# Altium schematic symbol library 13-Logicold 逻辑 IC.SchLib: 297 symbols (part 13 of 30)
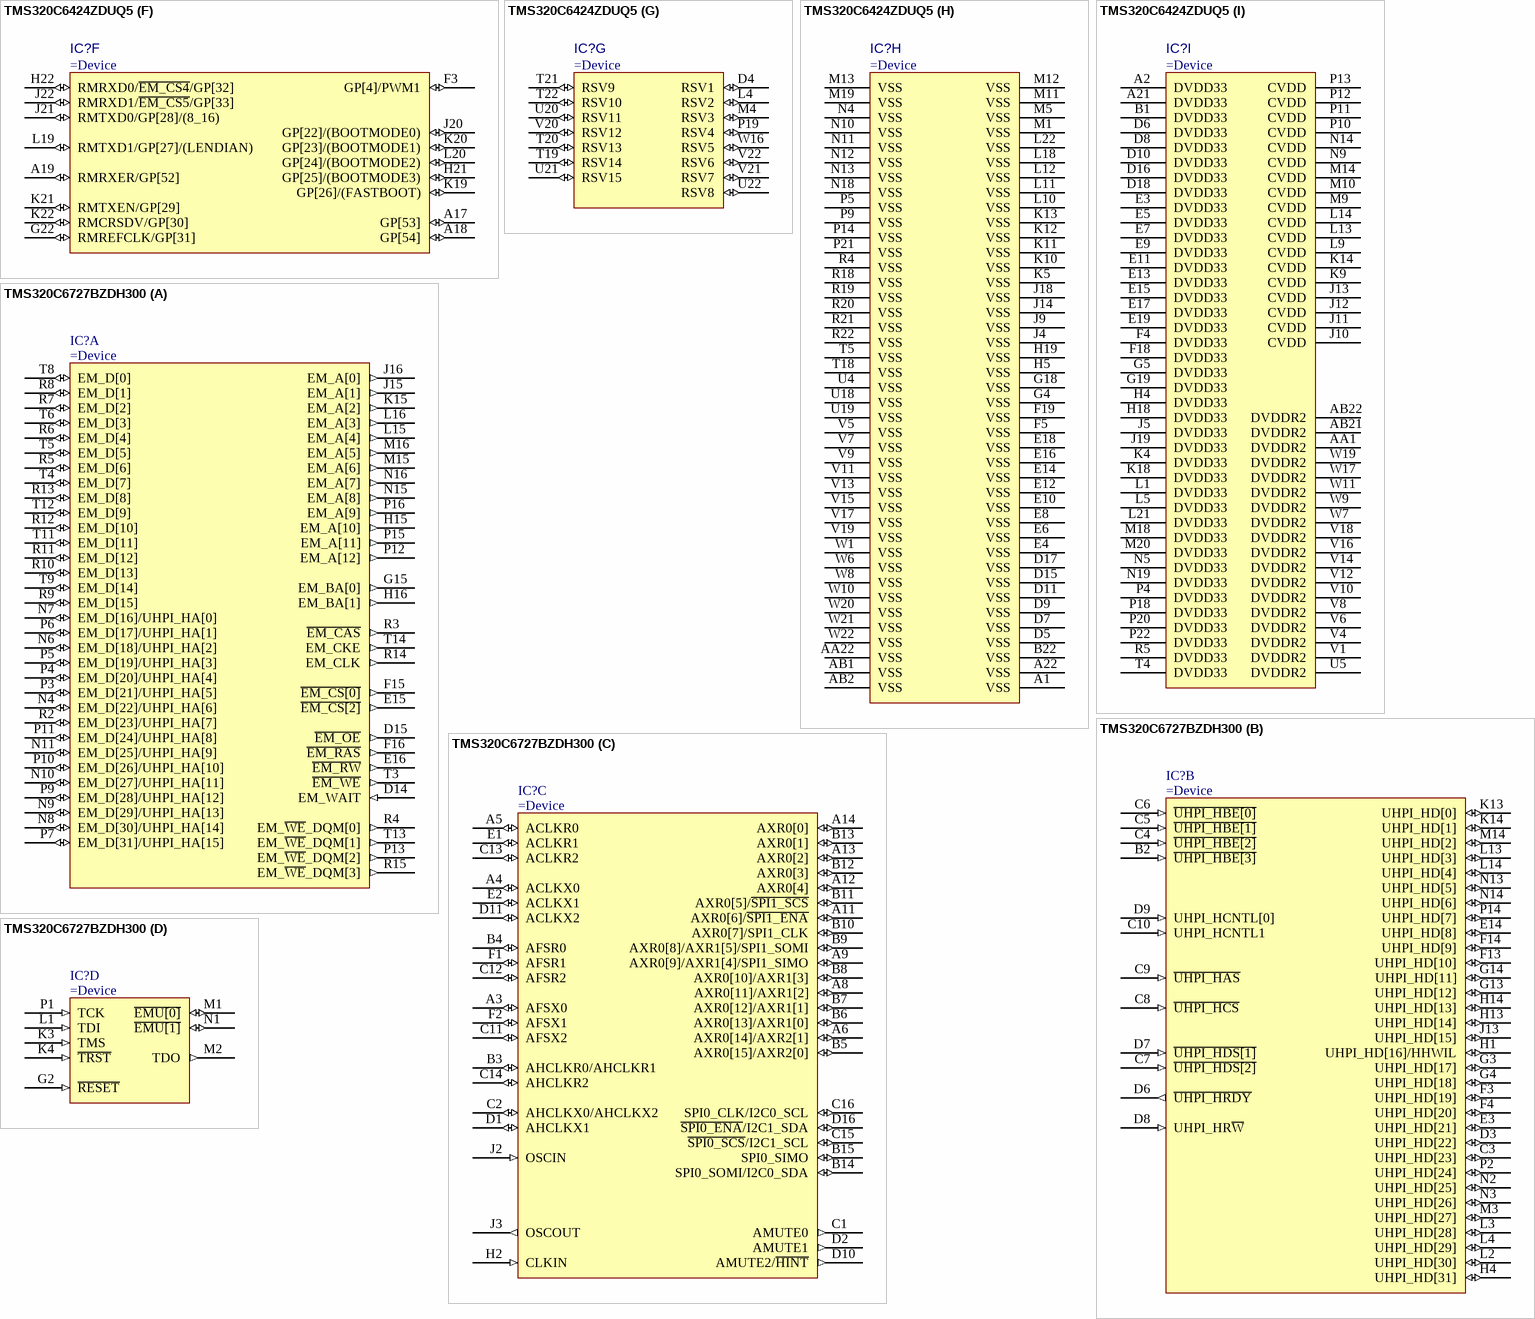
[diagram p174: symbols TMS320C6424ZDUQ5 to TMS320C6727BZDH300]

## TMS320C6424ZDUQ5
designator IC?
Fixed-Point Digital Signal Processor (DSP)
part A pins: M21 MXVSS (io), M22 MXO (out), N2 SCL (io), N20 PLLPWR18 (power), N21 MXVDD (power), N22 MXI/CLKIN (in), P2 SDA (io), R2 ~{POR} (in), R3 ~{RESET} (in), T1 EMU0 (io), T2 EMU1 (io), T3 ~{RESETOUT} (out), U1 TCK (in), U2 TDO (out), U3 TDI (in), V2 ~{TRST} (in), V3 TMS (in), W3 PCIEN (in)
part B pins: G1 ACLKX0/CLKX1/GP[106] (io), G2 AFSX0/DX1/GP[107] (io), G3 AMUTEIN0/FSX1/GP[109] (io), H1 AHCLKX0/CLKR1/GP[108] (io), H2 AXR0[0]/FSR1/GP[105] (io), H3 AMUTE0/DR1/GP[110] (io), J1 ACLKR0/CLKX0/GP[99] (io), J2 AXR0[2]/FSX0/GP[103] (io), J3 AXR0[3]/FSR0/GP[102] (io), K1 AHCLKR0/CLKR0/GP[101] (io), K2 AXR0[1]/DX0/GP[104] (io), K3 AFSR0/DR0/GP[100] (io), L2 CLKS1/TINP0L/GP[98] (io), L3 CLKS0/TOUT0L/GP[97] (io), M2 URXD0/GP[85] (io), M3 URTS0/PWM0/GP[88] (io), N1 UTXD0/GP[86] (io), N3 TOUT1L/UTXD1/GP[55] (io), P1 UCTS0/GP[87] (io), P3 TINP1L/URXD1/GP[56] (io), R1 CLKOUT0/PWM2/GP[84] (io)
part C pins: AA2 DDR_D[3] (io), AA3 DDR_D[4] (io), AA4 DDR_DQS[0] (io), AA5 DDR_D[10] (io), AA6 DDR_D[13] (io), AA7 DDR_DQS[1] (io), AA8 DDR_CKE (io), AA9 DDR_BS[0] (io), AA10 DDR_A[12] (io), AA11 DDR_A[11] (io), AA12 DDR_A[9] (io), AA13 DDR_A[6] (io), AA14 DDR_A[3] (io), AA15 DDR_DQS[2] (io), AA16 DDR_D[16] (io), AA17 DDR_D[19] (io), AA18 DDR_DQS[3] (io), AA19 DDR_D[23] (io), AA20 DDR_D[26] (io), AA21 DDR_D[30] (io), AB3 DDR_D[6] (io), AB4 DDR_D[8] (io), AB5 DDR_D[12] (io), AB6 DDR_D[15] (io), AB7 DDR_CLK0 (io), AB8 ~{DDR_CLK0} (io), AB9 DDR_BS[1] (io), AB10 DDR_BS[2] (io), AB11 DDR_A[10] (io), AB12 DDR_A[7] (io), AB13 DDR_A[4] (io), AB14 DDR_A[1] (io), AB15 DDR_A[0] (io), AB16 DDR_D[18] (io), AB17 DDR_D[21] (io), AB18 DDR_D[22] (io), AB19 DDR_D[25] (io), AB20 DDR_D[28] (io), W2 DDR_D[2] (io), W4 DDR_D[7] (io), W5 DDR_D[9] (io), W12 DDR_ZN (out), W13 DDR_ZP (out), W14 DDR_VDDDLL (power), W15 DDR_VSSDLL (io), W18 DDR_VREF (in), Y1 DDR_D[0] (io), Y2 DDR_D[1] (io), Y3 DDR_D[5] (io), Y4 DDR_DQM[0] (io), Y5 DDR_D[11] (io), Y6 DDR_D[14] (io), Y7 DDR_DQM[1] (io), Y8 ~{DDR_RAS} (io), Y9 ~{DDR_CAS} (io), Y10 ~{DDR_WE} (io), Y11 ~{DDR_CS} (io), Y12 DDR_A[8] (io), Y13 DDR_A[5] (io), Y14 DDR_A[2] (io), Y15 DDR_DQM[2] (io), Y16 DDR_D[17] (io), Y17 DDR_D[20] (io), Y18 DDR_DQM[3] (io), Y19 DDR_D[24] (io), Y20 DDR_D[27] (io), Y21 DDR_D[29] (io), Y22 DDR_D[31] (io)
part D pins: A3 HR/~{W}/MRXCLK/AD8/GP[77] (io), A4 HD15/MTXCLK/AD12/GP[73] (io), A5 HD11/MTXD3/~{PCBE1}/GP[69] (io), A6 HD8/VLYNQ_TXD3/~{PPERR}/GP[66] (io), A7 HD5/VLYNQ_TXD0/~{PIRDY}/GP[63] (io), A8 VLYNQ_CLOCK/PCICLK/GP[57] (io), A9 HD2/VLYNQ_RXD1/AD17/GP[60] (io), B2 HCNTL0/MRXER/AD10/GP[76] (io), B3 ~{HDS1}/MRXD1/AD7/GP[79] (io), B4 HD13/MTXD1/AD14/GP[71] (io), B5 HD14/MTXD0/AD15/GP[72] (io), B6 HD10/MCRS/~{PSERR}/GP[68] (io), B7 HD7/VLYNQ_TXD2/~{PDEVSEL}/GP[65] (io), B8 HD3/VLYNQ_RXD2/~{PCBE2}/GP[61] (io), B9 HD0/VLYNQ_SCRUN/AD18/GP[58] (io), C1 ~{HAS}/MDIO/AD3/GP[83] (io), C2 ~{HDS2}/MRXD0/AD9/GP[78] (io), C3 ~{HRDY}/MRXD2/~{PCBE0}/GP[80] (io), C4 HCNTL1/MTXEN/AD11/GP[75] (io), C5 HD12/MTXD2/PPAR/GP[70] (io), C6 HD9/MCOL/~{PSTOP}/GP[67] (io), C7 HD6/VLYNQ_TXD1/~{PTRDY}/GP[64] (io), C8 HD4/VLYNQ_RXD3/~{PFRAME}/GP[62] (io), C9 HD1/VLYNQ_RXD0/AD16/GP[59] (io), D1 ~{HCS}/MDCLK/AD5/GP[81] (io), D2 ~{HINT}/MRXD3/AD6/GP[82] (io), D3 HHWIL/MRXDV/AD13/GP[74] (io), D12 AD26 (io), D13 AD28 (io), D14 AD30 (io), E1 AD0/GP[0] (io), E2 AD1/GP[1] (io), F1 AD2/GP[2] (io), F2 AD4/GP[3] (io)
part E pins: A10 EM_A[5]/AD19/GP[96] (io), A11 EM_A[8]/AD21/GP[93] (io), A12 EM_A[13]/AD25/GP[51] (io), A13 EM_A[14]/AD27/GP[50] (io), A14 EM_A[18]/~{PRST}/GP[46] (io), A15 EM_D[8]/GP[43] (io), A16 EM_D[12]/GP[39] (io), A20 EM_A[2]/(CLE)/GP[8]/(PLLMS0) (io), B10 EM_A[6]/AD20/GP[95] (io), B11 EM_A[10]/AD23/GP[91] (io), B12 EM_A[12]/~{PCBE3}/GP[89] (io), B13 EM_A[16]/~{PGNT}/GP[48] (io), B14 EM_A[17]/AD31/GP[47] (io), B15 EM_D[9]/GP[42] (io), B16 EM_D[10]/GP[41] (io), B17 EM_D[13]/GP[38] (io), B18 EM_D[14]/GP[37] (io), B19 EM_D[15]/GP[36] (io), B20 EM_A[1]/(ALE)/GP[9]/(PLLMS1) (io), B21 EM_A[4]/GP[10]/(PLLMS2) (io), C10 EM_A[7]/AD22/GP[94] (io), C11 EM_A[9]/PIDSEL/GP[92] (io), C12 EM_A[11]/AD24/GP[90] (io), C13 EM_A[15]/AD29/GP[49] (io), C14 EM_A[19]/~{PREQ}/GP[45] (io), C15 EM_A[20]/~{PINTA}/GP[44] (io), C16 EM_A[21]/GP[34] (io), C17 EM_R/~{W}/GP[35] (io), C18 EM_D[11]/GP[40] (io), C19 ~{EM_WE} (io), C20 EM_BA[1]/GP[5]/(AEM0) (io), C21 EM_A[0]/GP[7]/(AEM2) (io), C22 ~{EM_CS2}/GP[12] (io), D19 ~{EM_OE} (io), D20 EM_WAIT/(RDY/~{BSY}) (io), D21 EM_A[3]/GP[11] (io), D22 ~{EM_CS3}/GP[13] (io), E20 EM_BA[0]/GP[6]/(AEM1) (io), E21 EM_D[0]/GP[14] (io), E22 EM_D[2]/GP[16] (io), F20 EM_D[3]/GP[17] (io), F21 EM_D[6]/GP[20] (io), F22 EM_D[5]/GP[19] (io), G20 EM_D[1]/GP[15] (io), G21 EM_D[4]/GP[18] (io), H20 EM_D[7]/GP[21] (io)
part F pins: A17 GP[53] (io), A18 GP[54] (io), A19 RMRXER/GP[52] (io), F3 GP[4]/PWM1 (io), G22 RMREFCLK/GP[31] (io), H21 GP[25]/(BOOTMODE3) (io), H22 RMRXD0/~{EM_CS4}/GP[32] (io), J20 GP[22]/(BOOTMODE0) (io), J21 RMTXD0/GP[28]/(8_16) (io), J22 RMRXD1/~{EM_CS5}/GP[33] (io), K19 GP[26]/(FASTBOOT) (io), K20 GP[23]/(BOOTMODE1) (io), K21 RMTXEN/GP[29] (io), K22 RMCRSDV/GP[30] (io), L19 RMTXD1/GP[27]/(LENDIAN) (io), L20 GP[24]/(BOOTMODE2) (io)
part G pins: D4 RSV1 (io), L4 RSV2 (io), M4 RSV3 (io), P19 RSV4 (io), T19 RSV14 (io), T20 RSV13 (io), T21 RSV9 (io), T22 RSV10 (io), U20 RSV11 (io), U21 RSV15 (io), U22 RSV8 (io), V20 RSV12 (io), V21 RSV7 (io), V22 RSV6 (io), W16 RSV5 (io)
part H pins: A1 VSS (power), A22 VSS (power), AA22 VSS (power), AB1 VSS (power), AB2 VSS (power), B22 VSS (power), D5 VSS (power), D7 VSS (power), D9 VSS (power), D11 VSS (power), D15 VSS (power), D17 VSS (power), E4 VSS (power), E6 VSS (power), E8 VSS (power), E10 VSS (power), E12 VSS (power), E14 VSS (power), E16 VSS (power), E18 VSS (power), F5 VSS (power), F19 VSS (power), G4 VSS (power), G18 VSS (power), H5 VSS (power), H19 VSS (power), J4 VSS (power), J9 VSS (power), J14 VSS (power), J18 VSS (power), K5 VSS (power), K10 VSS (power), K11 VSS (power), K12 VSS (power), K13 VSS (power), L10 VSS (power), L11 VSS (power), L12 VSS (power), L18 VSS (power), L22 VSS (power), M1 VSS (power), M5 VSS (power), M11 VSS (power), M12 VSS (power), M13 VSS (power), M19 VSS (power), N4 VSS (power), N10 VSS (power), N11 VSS (power), N12 VSS (power), N13 VSS (power), N18 VSS (power), P5 VSS (power), P9 VSS (power), P14 VSS (power), P21 VSS (power), R4 VSS (power), R18 VSS (power), R19 VSS (power), R20 VSS (power), R21 VSS (power), R22 VSS (power), T5 VSS (power), T18 VSS (power), U4 VSS (power), U18 VSS (power), U19 VSS (power), V5 VSS (power), V7 VSS (power), V9 VSS (power), V11 VSS (power), V13 VSS (power), V15 VSS (power), V17 VSS (power), V19 VSS (power), W1 VSS (power), W6 VSS (power), W8 VSS (power), W10 VSS (power), W20 VSS (power), W21 VSS (power), W22 VSS (power)
part I pins: A2 DVDD33 (power), A21 DVDD33 (power), AA1 DVDDR2 (power), AB21 DVDDR2 (power), AB22 DVDDR2 (power), B1 DVDD33 (power), D6 DVDD33 (power), D8 DVDD33 (power), D10 DVDD33 (power), D16 DVDD33 (power), D18 DVDD33 (power), E3 DVDD33 (power), E5 DVDD33 (power), E7 DVDD33 (power), E9 DVDD33 (power), E11 DVDD33 (power), E13 DVDD33 (power), E15 DVDD33 (power), E17 DVDD33 (power), E19 DVDD33 (power), F4 DVDD33 (power), F18 DVDD33 (power), G5 DVDD33 (power), G19 DVDD33 (power), H4 DVDD33 (power), H18 DVDD33 (power), J5 DVDD33 (power), J10 CVDD (power), J11 CVDD (power), J12 CVDD (power), J13 CVDD (power), J19 DVDD33 (power), K4 DVDD33 (power), K9 CVDD (power), K14 CVDD (power), K18 DVDD33 (power), L1 DVDD33 (power), L5 DVDD33 (power), L9 CVDD (power), L13 CVDD (power), L14 CVDD (power), L21 DVDD33 (power), M9 CVDD (power), M10 CVDD (power), M14 CVDD (power), M18 DVDD33 (power), M20 DVDD33 (power), N5 DVDD33 (power), N9 CVDD (power), N14 CVDD (power), N19 DVDD33 (power), P4 DVDD33 (power), P10 CVDD (power), P11 CVDD (power), P12 CVDD (power), P13 CVDD (power), P18 DVDD33 (power), P20 DVDD33 (power), P22 DVDD33 (power), R5 DVDD33 (power), T4 DVDD33 (power), U5 DVDDR2 (power), V1 DVDDR2 (power), V4 DVDDR2 (power), V6 DVDDR2 (power), V8 DVDDR2 (power), V10 DVDDR2 (power), V12 DVDDR2 (power), V14 DVDDR2 (power), V16 DVDDR2 (power), V18 DVDDR2 (power), W7 DVDDR2 (power), W9 DVDDR2 (power), W11 DVDDR2 (power), W17 DVDDR2 (power), W19 DVDDR2 (power)

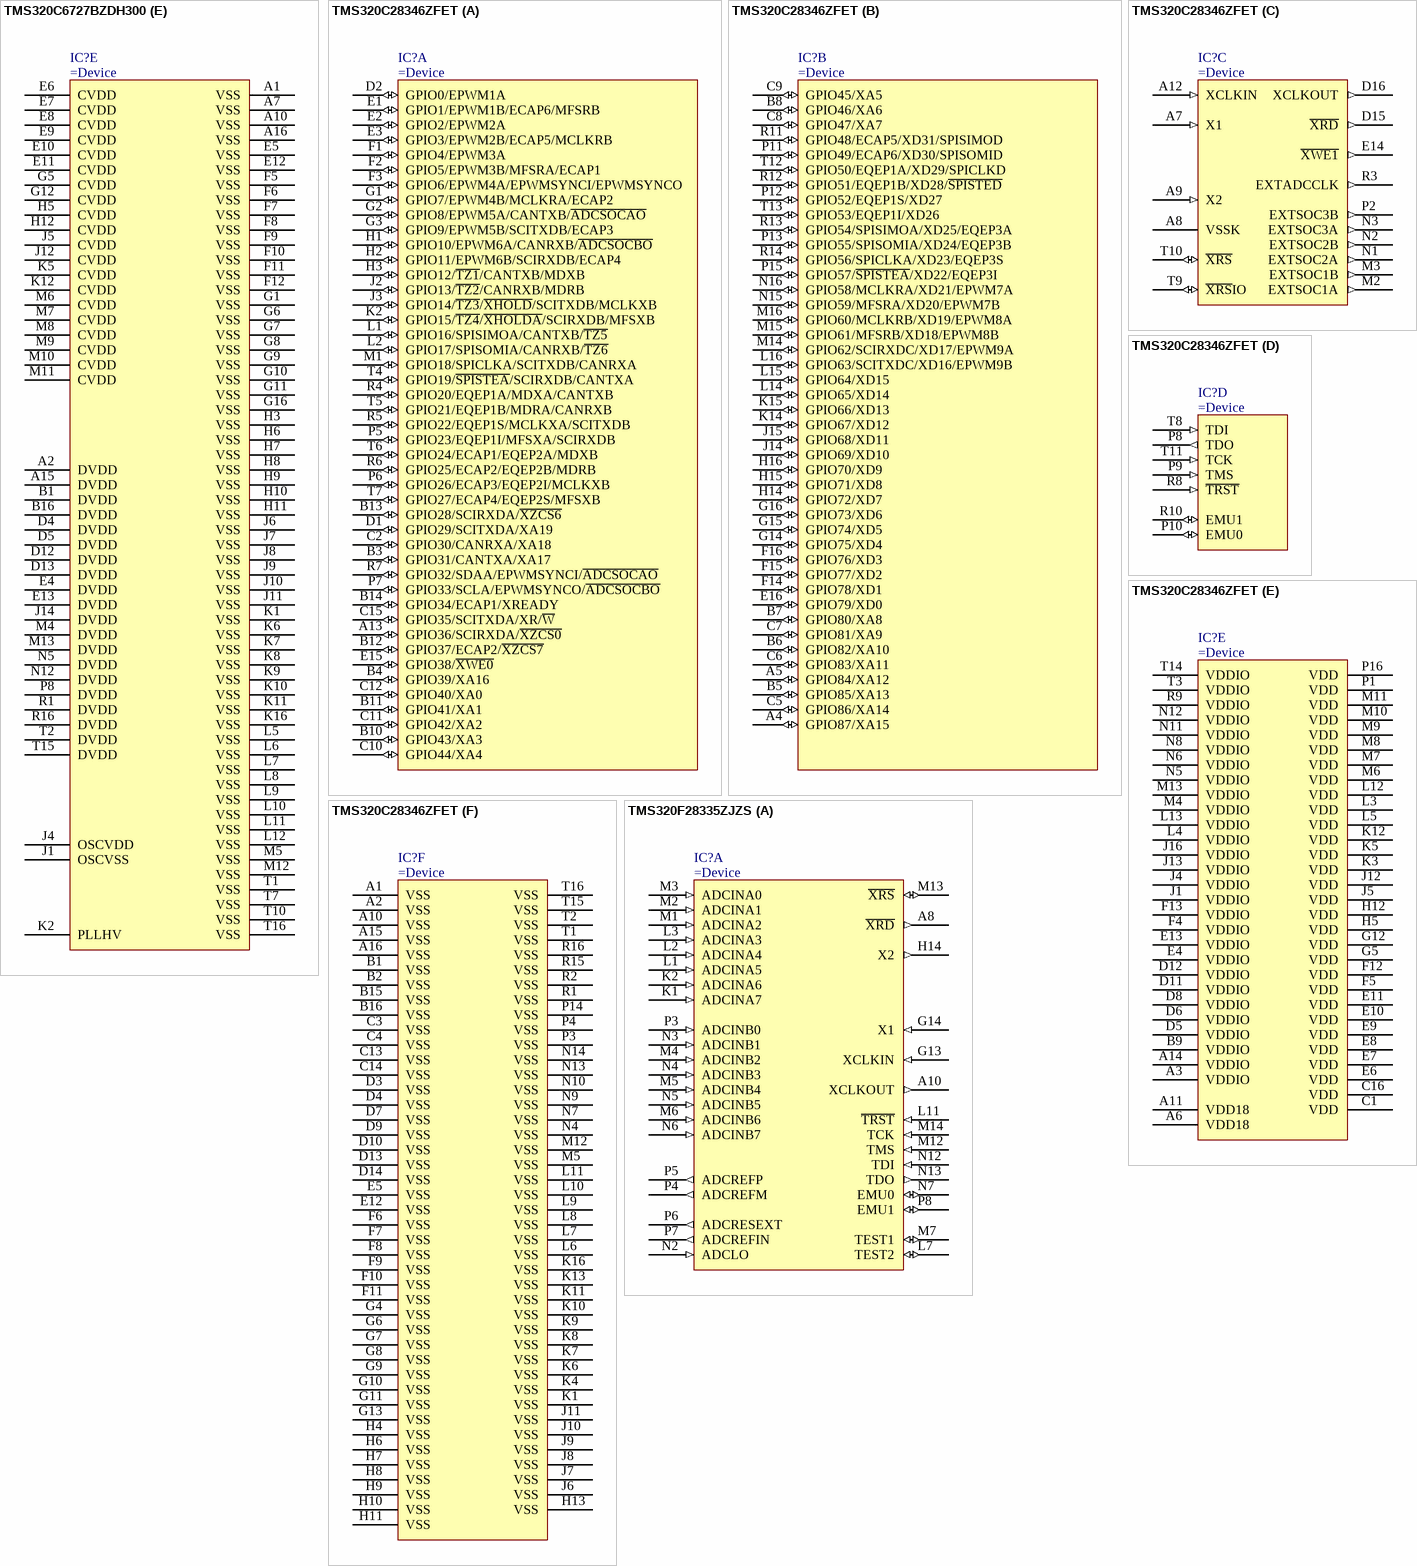
[diagram p78: symbols TMS320C6727BZDH300 to TMS320F28335ZJZS]

## TMS320C6727BZDH300
designator IC?
Floating-Point Digital Signal Processor (DSP)
part A pins: D14 EM_WAIT (in), D15 ~{EM_OE} (out), E15 ~{EM_CS[2]} (out), E16 ~{EM_RW} (out), F15 ~{EM_CS[0]} (out), F16 ~{EM_RAS} (out), G15 EM_BA[0] (out), H15 EM_A[10] (out), H16 EM_BA[1] (out), J15 EM_A[1] (out), J16 EM_A[0] (out), K15 EM_A[2] (out), L15 EM_A[4] (out), L16 EM_A[3] (out), M15 EM_A[6] (out), M16 EM_A[5] (out), N4 EM_D[22]/UHPI_HA[6] (io), N6 EM_D[18]/UHPI_HA[2] (io), N7 EM_D[16]/UHPI_HA[0] (io), N8 EM_D[30]/UHPI_HA[14] (io), N9 EM_D[29]/UHPI_HA[13] (io), N10 EM_D[27]/UHPI_HA[11] (io), N11 EM_D[25]/UHPI_HA[9] (io), N15 EM_A[8] (out), N16 EM_A[7] (out), P3 EM_D[21]/UHPI_HA[5] (io), P4 EM_D[20]/UHPI_HA[4] (io), P5 EM_D[19]/UHPI_HA[3] (io), P6 EM_D[17]/UHPI_HA[1] (io), P7 EM_D[31]/UHPI_HA[15] (io), P9 EM_D[28]/UHPI_HA[12] (io), P10 EM_D[26]/UHPI_HA[10] (io), P11 EM_D[24]/UHPI_HA[8] (io), P12 EM_A[12] (out), P13 EM_~{WE}_DQM[2] (out), P15 EM_A[11] (out), P16 EM_A[9] (out), R2 EM_D[23]/UHPI_HA[7] (io), R3 ~{EM_CAS} (out), R4 EM_~{WE}_DQM[0] (out), R5 EM_D[6] (io), R6 EM_D[4] (io), R7 EM_D[2] (io), R8 EM_D[1] (io), R9 EM_D[15] (io), R10 EM_D[13] (io), R11 EM_D[12] (io), R12 EM_D[10] (io), R13 EM_D[8] (io), R14 EM_CLK (out), R15 EM_~{WE}_DQM[3] (out), T3 ~{EM_WE} (out), T4 EM_D[7] (io), T5 EM_D[5] (io), T6 EM_D[3] (io), T8 EM_D[0] (io), T9 EM_D[14] (io), T11 EM_D[11] (io), T12 EM_D[9] (io), T13 EM_~{WE}_DQM[1] (out), T14 EM_CKE (out)
part B pins: B2 ~{UHPI_HBE[3]} (in), C3 UHPI_HD[23] (io), C4 ~{UHPI_HBE[2]} (in), C5 ~{UHPI_HBE[1]} (in), C6 ~{UHPI_HBE[0]} (in), C7 ~{UHPI_HDS[2]} (in), C8 ~{UHPI_HCS} (in), C9 ~{UHPI_HAS} (in), C10 UHPI_HCNTL1 (in), D3 UHPI_HD[22] (io), D6 ~{UHPI_HRDY} (out), D7 ~{UHPI_HDS[1]} (in), D8 UHPI_HR~{W} (in), D9 UHPI_HCNTL[0] (in), E3 UHPI_HD[21] (io), E14 UHPI_HD[8] (io), F3 UHPI_HD[19] (io), F4 UHPI_HD[20] (io), F13 UHPI_HD[10] (io), F14 UHPI_HD[9] (io), G3 UHPI_HD[17] (io), G4 UHPI_HD[18] (io), G13 UHPI_HD[12] (io), G14 UHPI_HD[11] (io), H1 UHPI_HD[16]/HHWIL (io), H4 UHPI_HD[31] (io), H13 UHPI_HD[14] (io), H14 UHPI_HD[13] (io), J13 UHPI_HD[15] (io), K13 UHPI_HD[0] (io), K14 UHPI_HD[1] (io), L2 UHPI_HD[30] (io), L3 UHPI_HD[28] (io), L4 UHPI_HD[29] (io), L13 UHPI_HD[3] (io), L14 UHPI_HD[4] (io), M3 UHPI_HD[27] (io), M14 UHPI_HD[2] (io), N2 UHPI_HD[25] (io), N3 UHPI_HD[26] (io), N13 UHPI_HD[5] (io), N14 UHPI_HD[6] (io), P2 UHPI_HD[24] (io), P14 UHPI_HD[7] (io)
part C pins: A3 AFSX0 (io), A4 ACLKX0 (io), A5 ACLKR0 (io), A6 AXR0[14]/AXR2[1] (io), A8 AXR0[11]/AXR1[2] (io), A9 AXR0[9]/AXR1[4]/SPI1_SIMO (io), A11 AXR0[6]/~{SPI1_ENA} (io), A12 AXR0[4] (io), A13 AXR0[2] (io), A14 AXR0[0] (io), B3 AHCLKR0/AHCLKR1 (io), B4 AFSR0 (io), B5 AXR0[15]/AXR2[0] (io), B6 AXR0[13]/AXR1[0] (io), B7 AXR0[12]/AXR1[1] (io), B8 AXR0[10]/AXR1[3] (io), B9 AXR0[8]/AXR1[5]/SPI1_SOMI (io), B10 AXR0[7]/SPI1_CLK (io), B11 AXR0[5]/~{SPI1_SCS} (io), B12 AXR0[3] (io), B13 AXR0[1] (io), B14 SPI0_SOMI/I2C0_SDA (io), B15 SPI0_SIMO (io), C1 AMUTE0 (out), C2 AHCLKX0/AHCLKX2 (io), C11 AFSX2 (io), C12 AFSR2 (io), C13 ACLKR2 (io), C14 AHCLKR2 (io), C15 ~{SPI0_SCS}/I2C1_SCL (io), C16 SPI0_CLK/I2C0_SCL (io), D1 AHCLKX1 (io), D2 AMUTE1 (out), D10 AMUTE2/~{HINT} (out), D11 ACLKX2 (io), D16 ~{SPI0_ENA}/I2C1_SDA (io), E1 ACLKR1 (io), E2 ACLKX1 (io), F1 AFSR1 (io), F2 AFSX1 (io), H2 CLKIN (in), J2 OSCIN (in), J3 OSCOUT (out)
part D pins: G2 ~{RESET} (in), K3 TMS (in), K4 ~{TRST} (in), L1 TDI (in), M1 ~{EMU[0]} (io), M2 TDO (out), N1 ~{EMU[1]} (io), P1 TCK (in)
part E pins: A1 VSS (power), A2 DVDD (power), A7 VSS (power), A10 VSS (power), A15 DVDD (power), A16 VSS (power), B1 DVDD (power), B16 DVDD (power), D4 DVDD (power), D5 DVDD (power), D12 DVDD (power), D13 DVDD (power), E4 DVDD (power), E5 VSS (power), E6 CVDD (power), E7 CVDD (power), E8 CVDD (power), E9 CVDD (power), E10 CVDD (power), E11 CVDD (power), E12 VSS (power), E13 DVDD (power), F5 VSS (power), F6 VSS (power), F7 VSS (power), F8 VSS (power), F9 VSS (power), F10 VSS (power), F11 VSS (power), F12 VSS (power), G1 VSS (power), G5 CVDD (power), G6 VSS (power), G7 VSS (power), G8 VSS (power), G9 VSS (power), G10 VSS (power), G11 VSS (power), G12 CVDD (power), G16 VSS (power), H3 VSS (power), H5 CVDD (power), H6 VSS (power), H7 VSS (power), H8 VSS (power), H9 VSS (power), H10 VSS (power), H11 VSS (power), H12 CVDD (power), J1 OSCVSS (power), J4 OSCVDD (power), J5 CVDD (power), J6 VSS (power), J7 VSS (power), J8 VSS (power), J9 VSS (power), J10 VSS (power), J11 VSS (power), J12 CVDD (power), J14 DVDD (power), K1 VSS (power), K2 PLLHV (power), K5 CVDD (power), K6 VSS (power), K7 VSS (power), K8 VSS (power), K9 VSS (power), K10 VSS (power), K11 VSS (power), K12 CVDD (power), K16 VSS (power), L5 VSS (power), L6 VSS (power), L7 VSS (power), L8 VSS (power), L9 VSS (power), L10 VSS (power), L11 VSS (power), L12 VSS (power), M4 DVDD (power), M5 VSS (power), M6 CVDD (power), M7 CVDD (power), M8 CVDD (power), M9 CVDD (power), M10 CVDD (power), M11 CVDD (power), M12 VSS (power), M13 DVDD (power), N5 DVDD (power), N12 DVDD (power), P8 DVDD (power), R1 DVDD (power), R16 DVDD (power), T1 VSS (power), T2 DVDD (power), T7 VSS (power), T10 VSS (power), T15 DVDD (power), T16 VSS (power)

## TMS320C28346ZFET
designator IC?
Delfino Microcontroller
part A pins: A13 GPIO36/SCIRXDA/~{XZCS0} (io), B3 GPIO31/CANTXA/XA17 (io), B4 GPIO39/XA16 (io), B10 GPIO43/XA3 (io), B11 GPIO41/XA1 (io), B12 GPIO37/ECAP2/~{XZCS7} (io), B13 GPIO28/SCIRXDA/~{XZCS6} (io), B14 GPIO34/ECAP1/XREADY (io), C2 GPIO30/CANRXA/XA18 (io), C10 GPIO44/XA4 (io), C11 GPIO42/XA2 (io), C12 GPIO40/XA0 (io), C15 GPIO35/SCITXDA/XR/~{W} (io), D1 GPIO29/SCITXDA/XA19 (io), D2 GPIO0/EPWM1A (io), E1 GPIO1/EPWM1B/ECAP6/MFSRB (io), E2 GPIO2/EPWM2A (io), E3 GPIO3/EPWM2B/ECAP5/MCLKRB (io), E15 GPIO38/~{XWE0} (io), F1 GPIO4/EPWM3A (io), F2 GPIO5/EPWM3B/MFSRA/ECAP1 (io), F3 GPIO6/EPWM4A/EPWMSYNCI/EPWMSYNCO (io), G1 GPIO7/EPWM4B/MCLKRA/ECAP2 (io), G2 GPIO8/EPWM5A/CANTXB/~{ADCSOCAO} (io), G3 GPIO9/EPWM5B/SCITXDB/ECAP3 (io), H1 GPIO10/EPWM6A/CANRXB/~{ADCSOCBO} (io), H2 GPIO11/EPWM6B/SCIRXDB/ECAP4 (io), H3 GPIO12/~{TZ1}/CANTXB/MDXB (io), J2 GPIO13/~{TZ2}/CANRXB/MDRB (io), J3 GPIO14/~{TZ3}/~{XHOLD}/SCITXDB/MCLKXB (io), K2 GPIO15/~{TZ4}/~{XHOLDA}/SCIRXDB/MFSXB (io), L1 GPIO16/SPISIMOA/CANTXB/~{TZ5} (io), L2 GPIO17/SPISOMIA/CANRXB/~{TZ6} (io), M1 GPIO18/SPICLKA/SCITXDB/CANRXA (io), P5 GPIO23/EQEP1I/MFSXA/SCIRXDB (io), P6 GPIO26/ECAP3/EQEP2I/MCLKXB (io), P7 GPIO33/SCLA/EPWMSYNCO/~{ADCSOCBO} (io), R4 GPIO20/EQEP1A/MDXA/CANTXB (io), R5 GPIO22/EQEP1S/MCLKXA/SCITXDB (io), R6 GPIO25/ECAP2/EQEP2B/MDRB (io), R7 GPIO32/SDAA/EPWMSYNCI/~{ADCSOCAO} (io), T4 GPIO19/~{SPISTEA}/SCIRXDB/CANTXA (io), T5 GPIO21/EQEP1B/MDRA/CANRXB (io), T6 GPIO24/ECAP1/EQEP2A/MDXB (io), T7 GPIO27/ECAP4/EQEP2S/MFSXB (io)
part B pins: A4 GPIO87/XA15 (io), A5 GPIO84/XA12 (io), B5 GPIO85/XA13 (io), B6 GPIO82/XA10 (io), B7 GPIO80/XA8 (io), B8 GPIO46/XA6 (io), C5 GPIO86/XA14 (io), C6 GPIO83/XA11 (io), C7 GPIO81/XA9 (io), C8 GPIO47/XA7 (io), C9 GPIO45/XA5 (io), E16 GPIO79/XD0 (io), F14 GPIO78/XD1 (io), F15 GPIO77/XD2 (io), F16 GPIO76/XD3 (io), G14 GPIO75/XD4 (io), G15 GPIO74/XD5 (io), G16 GPIO73/XD6 (io), H14 GPIO72/XD7 (io), H15 GPIO71/XD8 (io), H16 GPIO70/XD9 (io), J14 GPIO69/XD10 (io), J15 GPIO68/XD11 (io), K14 GPIO67/XD12 (io), K15 GPIO66/XD13 (io), L14 GPIO65/XD14 (io), L15 GPIO64/XD15 (io), L16 GPIO63/SCITXDC/XD16/EPWM9B (io), M14 GPIO62/SCIRXDC/XD17/EPWM9A (io), M15 GPIO61/MFSRB/XD18/EPWM8B (io), M16 GPIO60/MCLKRB/XD19/EPWM8A (io), N15 GPIO59/MFSRA/XD20/EPWM7B (io), N16 GPIO58/MCLKRA/XD21/EPWM7A (io), P11 GPIO49/ECAP6/XD30/SPISOMID (io), P12 GPIO52/EQEP1S/XD27 (io), P13 GPIO55/SPISOMIA/XD24/EQEP3B (io), P15 GPIO57/~{SPISTEA}/XD22/EQEP3I (io), R11 GPIO48/ECAP5/XD31/SPISIMOD (io), R12 GPIO51/EQEP1B/XD28/~{SPISTED} (io), R13 GPIO54/SPISIMOA/XD25/EQEP3A (io), R14 GPIO56/SPICLKA/XD23/EQEP3S (io), T12 GPIO50/EQEP1A/XD29/SPICLKD (io), T13 GPIO53/EQEP1I/XD26 (io)
part C pins: A7 X1 (in), A8 VSSK (power), A9 X2 (in), A12 XCLKIN (in), D15 ~{XRD} (out), D16 XCLKOUT (out), E14 ~{XWE1} (out), M2 EXTSOC1A (out), M3 EXTSOC1B (out), N1 EXTSOC2A (out), N2 EXTSOC2B (out), N3 EXTSOC3A (out), P2 EXTSOC3B (out), R3 EXTADCCLK (out), T9 ~{XRS}IO (io), T10 ~{XRS} (io)
part D pins: P8 TDO (out), P9 TMS (in), P10 EMU0 (io), R8 ~{TRST} (in), R10 EMU1 (io), T8 TDI (in), T11 TCK (in)
part E pins: A3 VDDIO (power), A6 VDD18 (power), A11 VDD18 (power), A14 VDDIO (power), B9 VDDIO (power), C1 VDD (power), C16 VDD (power), D5 VDDIO (power), D6 VDDIO (power), D8 VDDIO (power), D11 VDDIO (power), D12 VDDIO (power), E4 VDDIO (power), E6 VDD (power), E7 VDD (power), E8 VDD (power), E9 VDD (power), E10 VDD (power), E11 VDD (power), E13 VDDIO (power), F4 VDDIO (power), F5 VDD (power), F12 VDD (power), F13 VDDIO (power), G5 VDD (power), G12 VDD (power), H5 VDD (power), H12 VDD (power), J1 VDDIO (power), J4 VDDIO (power), J5 VDD (power), J12 VDD (power), J13 VDDIO (power), J16 VDDIO (power), K3 VDD (power), K5 VDD (power), K12 VDD (power), L3 VDD (power), L4 VDDIO (power), L5 VDD (power), L12 VDD (power), L13 VDDIO (power), M4 VDDIO (power), M6 VDD (power), M7 VDD (power), M8 VDD (power), M9 VDD (power), M10 VDD (power), M11 VDD (power), M13 VDDIO (power), N5 VDDIO (power), N6 VDDIO (power), N8 VDDIO (power), N11 VDDIO (power), N12 VDDIO (power), P1 VDD (power), P16 VDD (power), R9 VDDIO (power), T3 VDDIO (power), T14 VDDIO (power)
part F pins: A1 VSS (power), A2 VSS (power), A10 VSS (power), A15 VSS (power), A16 VSS (power), B1 VSS (power), B2 VSS (power), B15 VSS (power), B16 VSS (power), C3 VSS (power), C4 VSS (power), C13 VSS (power), C14 VSS (power), D3 VSS (power), D4 VSS (power), D7 VSS (power), D9 VSS (power), D10 VSS (power), D13 VSS (power), D14 VSS (power), E5 VSS (power), E12 VSS (power), F6 VSS (power), F7 VSS (power), F8 VSS (power), F9 VSS (power), F10 VSS (power), F11 VSS (power), G4 VSS (power), G6 VSS (power), G7 VSS (power), G8 VSS (power), G9 VSS (power), G10 VSS (power), G11 VSS (power), G13 VSS (power), H4 VSS (power), H6 VSS (power), H7 VSS (power), H8 VSS (power), H9 VSS (power), H10 VSS (power), H11 VSS (power), H13 VSS (power), J6 VSS (power), J7 VSS (power), J8 VSS (power), J9 VSS (power), J10 VSS (power), J11 VSS (power), K1 VSS (power), K4 VSS (power), K6 VSS (power), K7 VSS (power), K8 VSS (power), K9 VSS (power), K10 VSS (power), K11 VSS (power), K13 VSS (power), K16 VSS (power), L6 VSS (power), L7 VSS (power), L8 VSS (power), L9 VSS (power), L10 VSS (power), L11 VSS (power), M5 VSS (power), M12 VSS (power), N4 VSS (power), N7 VSS (power), N9 VSS (power), N10 VSS (power), N13 VSS (power), N14 VSS (power), P3 VSS (power), P4 VSS (power), P14 VSS (power), R1 VSS (power), R2 VSS (power), R15 VSS (power), R16 VSS (power), T1 VSS (power), T2 VSS (power), T15 VSS (power), T16 VSS (power)

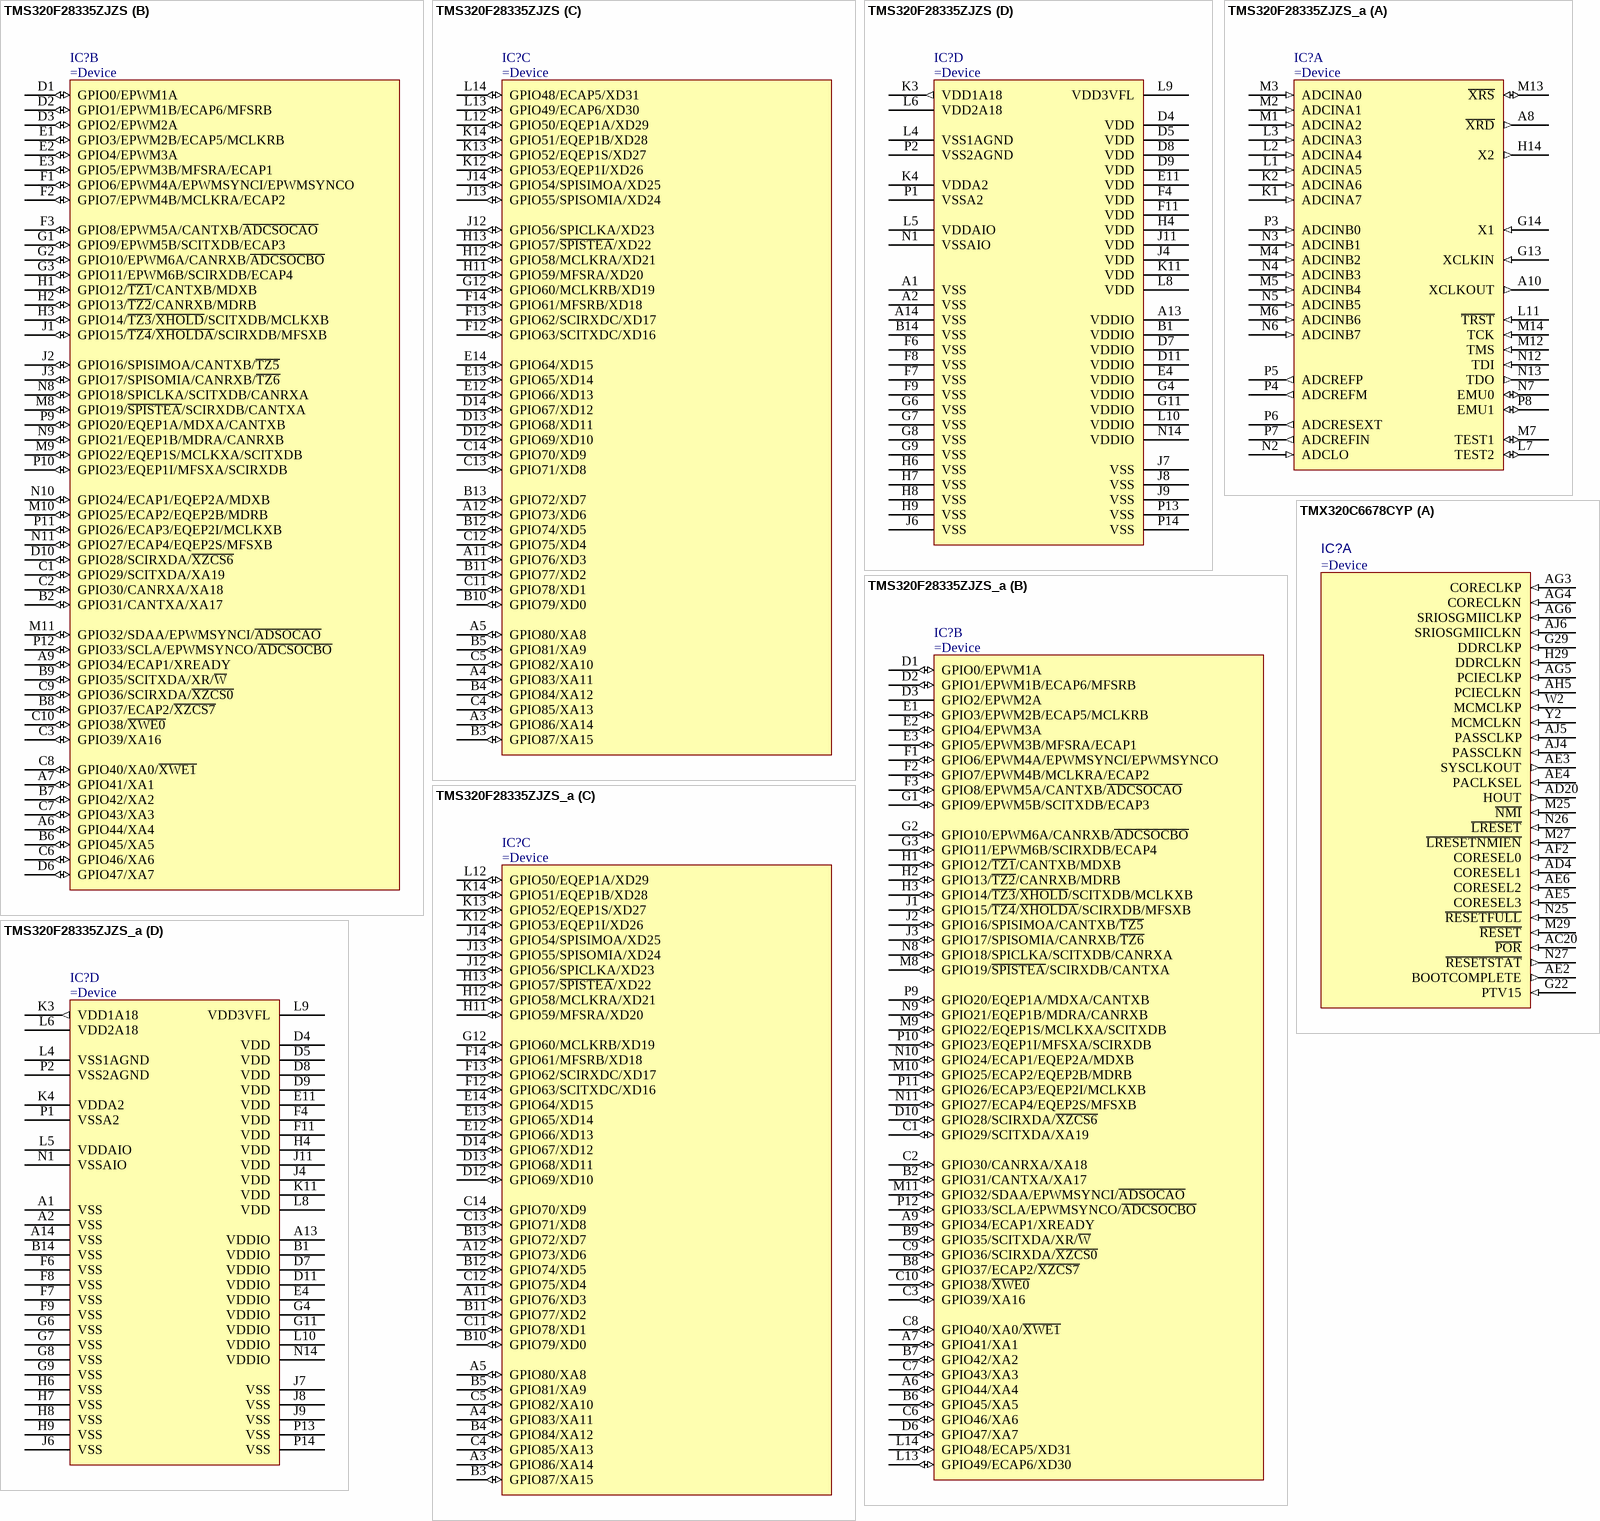
[diagram p79: symbols TMS320F28335ZJZS to TMX320C6678CYP]

## TMS320F28335ZJZS
designator IC?
32-Bit 150MHz Digital Signal Processor (DSP)
part A pins: A8 ~{XRD} (out), A10 XCLKOUT (out), G13 XCLKIN (in), G14 X1 (in), H14 X2 (out), K1 ADCINA7 (in), K2 ADCINA6 (in), L1 ADCINA5 (in), L2 ADCINA4 (in), L3 ADCINA3 (in), L7 TEST2 (io), L11 ~{TRST} (in), M1 ADCINA2 (in), M2 ADCINA1 (in), M3 ADCINA0 (in), M4 ADCINB2 (in), M5 ADCINB4 (in), M6 ADCINB6 (in), M7 TEST1 (io), M12 TMS (in), M13 ~{XRS} (io), M14 TCK (in), N2 ADCLO (in), N3 ADCINB1 (in), N4 ADCINB3 (in), N5 ADCINB5 (in), N6 ADCINB7 (in), N7 EMU0 (io), N12 TDI (in), N13 TDO (out), P3 ADCINB0 (in), P4 ADCREFM (out), P5 ADCREFP (out), P6 ADCRESEXT (out), P7 ADCREFIN (out), P8 EMU1 (io)
part B pins: A6 GPIO44/XA4 (io), A7 GPIO41/XA1 (io), A9 GPIO34/ECAP1/XREADY (io), B2 GPIO31/CANTXA/XA17 (io), B6 GPIO45/XA5 (io), B7 GPIO42/XA2 (io), B8 GPIO37/ECAP2/~{XZCS7} (io), B9 GPIO35/SCITXDA/XR/~{W} (io), C1 GPIO29/SCITXDA/XA19 (io), C2 GPIO30/CANRXA/XA18 (io), C3 GPIO39/XA16 (io), C6 GPIO46/XA6 (io), C7 GPIO43/XA3 (io), C8 GPIO40/XA0/~{XWE1} (io), C9 GPIO36/SCIRXDA/~{XZCS0} (io), C10 GPIO38/~{XWE0} (io), D1 GPIO0/EPWM1A (io), D2 GPIO1/EPWM1B/ECAP6/MFSRB (io), D3 GPIO2/EPWM2A (io), D6 GPIO47/XA7 (io), D10 GPIO28/SCIRXDA/~{XZCS6} (io), E1 GPIO3/EPWM2B/ECAP5/MCLKRB (io), E2 GPIO4/EPWM3A (io), E3 GPIO5/EPWM3B/MFSRA/ECAP1 (io), F1 GPIO6/EPWM4A/EPWMSYNCI/EPWMSYNCO (io), F2 GPIO7/EPWM4B/MCLKRA/ECAP2 (io), F3 GPIO8/EPWM5A/CANTXB/~{ADCSOCAO} (io), G1 GPIO9/EPWM5B/SCITXDB/ECAP3 (io), G2 GPIO10/EPWM6A/CANRXB/~{ADCSOCBO} (io), G3 GPIO11/EPWM6B/SCIRXDB/ECAP4 (io), H1 GPIO12/~{TZ1}/CANTXB/MDXB (io), H2 GPIO13/~{TZ2}/CANRXB/MDRB (io), H3 GPIO14/~{TZ3}/~{XHOLD}/SCITXDB/MCLKXB (io), J1 GPIO15/~{TZ4}/~{XHOLDA}/SCIRXDB/MFSXB (io), J2 GPIO16/SPISIMOA/CANTXB/~{TZ5} (io), J3 GPIO17/SPISOMIA/CANRXB/~{TZ6} (io), M8 GPIO19/~{SPISTEA}/SCIRXDB/CANTXA (io), M9 GPIO22/EQEP1S/MCLKXA/SCITXDB (io), M10 GPIO25/ECAP2/EQEP2B/MDRB (io), M11 GPIO32/SDAA/EPWMSYNCI/~{ADSOCAO} (io), N8 GPIO18/SPICLKA/SCITXDB/CANRXA (io), N9 GPIO21/EQEP1B/MDRA/CANRXB (io), N10 GPIO24/ECAP1/EQEP2A/MDXB (io), N11 GPIO27/ECAP4/EQEP2S/MFSXB (io), P9 GPIO20/EQEP1A/MDXA/CANTXB (io), P10 GPIO23/EQEP1I/MFSXA/SCIRXDB (io), P11 GPIO26/ECAP3/EQEP2I/MCLKXB (io), P12 GPIO33/SCLA/EPWMSYNCO/~{ADCSOCBO} (io)
part C pins: A3 GPIO86/XA14 (io), A4 GPIO83/XA11 (io), A5 GPIO80/XA8 (io), A11 GPIO76/XD3 (io), A12 GPIO73/XD6 (io), B3 GPIO87/XA15 (io), B4 GPIO84/XA12 (io), B5 GPIO81/XA9 (io), B10 GPIO79/XD0 (io), B11 GPIO77/XD2 (io), B12 GPIO74/XD5 (io), B13 GPIO72/XD7 (io), C4 GPIO85/XA13 (io), C5 GPIO82/XA10 (io), C11 GPIO78/XD1 (io), C12 GPIO75/XD4 (io), C13 GPIO71/XD8 (io), C14 GPIO70/XD9 (io), D12 GPIO69/XD10 (io), D13 GPIO68/XD11 (io), D14 GPIO67/XD12 (io), E12 GPIO66/XD13 (io), E13 GPIO65/XD14 (io), E14 GPIO64/XD15 (io), F12 GPIO63/SCITXDC/XD16 (io), F13 GPIO62/SCIRXDC/XD17 (io), F14 GPIO61/MFSRB/XD18 (io), G12 GPIO60/MCLKRB/XD19 (io), H11 GPIO59/MFSRA/XD20 (io), H12 GPIO58/MCLKRA/XD21 (io), H13 GPIO57/~{SPISTEA}/XD22 (io), J12 GPIO56/SPICLKA/XD23 (io), J13 GPIO55/SPISOMIA/XD24 (io), J14 GPIO54/SPISIMOA/XD25 (io), K12 GPIO53/EQEP1I/XD26 (io), K13 GPIO52/EQEP1S/XD27 (io), K14 GPIO51/EQEP1B/XD28 (io), L12 GPIO50/EQEP1A/XD29 (io), L13 GPIO49/ECAP6/XD30 (io), L14 GPIO48/ECAP5/XD31 (io)
part D pins: A1 VSS (power), A2 VSS (power), A13 VDDIO (power), A14 VSS (power), B1 VDDIO (power), B14 VSS (power), D4 VDD (power), D5 VDD (power), D7 VDDIO (power), D8 VDD (power), D9 VDD (power), D11 VDDIO (power), E4 VDDIO (power), E11 VDD (power), F4 VDD (power), F6 VSS (power), F7 VSS (power), F8 VSS (power), F9 VSS (power), F11 VDD (power), G4 VDDIO (power), G6 VSS (power), G7 VSS (power), G8 VSS (power), G9 VSS (power), G11 VDDIO (power), H4 VDD (power), H6 VSS (power), H7 VSS (power), H8 VSS (power), H9 VSS (power), J4 VDD (power), J6 VSS (power), J7 VSS (power), J8 VSS (power), J9 VSS (power), J11 VDD (power), K3 VDD1A18 (out), K4 VDDA2 (power), K11 VDD (power), L4 VSS1AGND (power), L5 VDDAIO (power), L6 VDD2A18 (power), L8 VDD (power), L9 VDD3VFL (power), L10 VDDIO (power), N1 VSSAIO (power), N14 VDDIO (power), P1 VSSA2 (power), P2 VSS2AGND (power), P13 VSS (power), P14 VSS (power)
